# Altium footprint library PCB1.PcbLib: 54 footprints (part 4 of 4)
Each footprint in its own frame and in the unit in brackets; x right, y up, seen from the top. Pads: shape width x height; smd on the part's side, far side on the other; paste and mask are expansions set on the pad; w line width, h text height; cw(c..) or ccw(c..) is an arc to the next point about the centre after c.
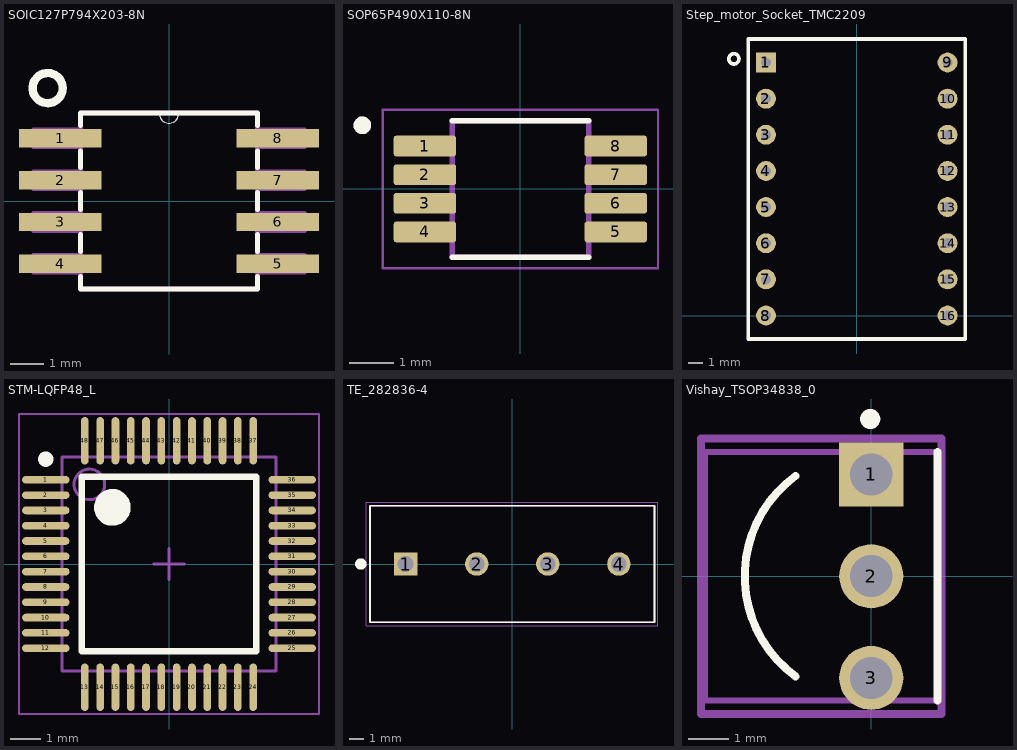
[diagram p3: the footprints below, top view; thin cyan lines are the x and y axes]

## SOIC127P794X203-8N [mil]
pads (8):
  rect 98.43x22 smd: 1(-130,75) 2(-130,25) 3(-130,-25) 4(-130,-75) 5(130,-75) 6(130,-25) 7(130,25) 8(130,75)
Top Overlay:
  circle w10: c-145,135 r18.03
  lines w0: -12,105 ccw(c0,105) 12,105
  lines w6: -106,-90 -106,-105 106,-105 106,-90 ; -106,-60 -106,-40 ; -106,-10 -106,10 ; -106,40 -106,60 ; -106,90 -106,105 -12,105 12,105 106,105 106,90 ; 106,-60 106,-40 ; 106,-10 106,10 ; 106,40 106,60
Mechanical 13:
  lines w0: -12,105 ccw(c0,105) 12,105
  lines w6: -162,-85 -106,-85 -106,-65 -162,-65 -162,-85 ; -162,-35 -106,-35 -106,-15 -162,-15 -162,-35 ; -162,15 -106,15 -106,35 -162,35 -162,15 ; -162,65 -106,65 -106,85 -162,85 -162,65 ; -106,-105 -106,105 -12,105 12,105 106,105 106,-105 -106,-105 ; 106,-85 162,-85 162,-65 106,-65 106,-85 ; 106,-35 162,-35 162,-15 106,-15 106,-35 ; 106,15 162,15 162,35 106,35 106,15 ; 106,65 162,65 162,85 106,85 106,65
3D body "SN.STEP": height 68.9, standoff 0, extent -118.11,-96.46 118.11,96.46

## SOP65P490X110-8N [mm]
pads (8):
  rrect25% 1.42x0.47 smd: 1(-2.165,0.975) 2(-2.165,0.325) 3(-2.165,-0.325) 4(-2.165,-0.975) 5(2.165,-0.975) 6(2.165,-0.325) 7(2.165,0.325) 8(2.165,0.975)
Top Overlay:
  circle w0.2: c-3.585,1.445 r0.1
  lines w0.127: -1.55,-1.55 1.55,-1.55 ; -1.55,1.55 1.55,1.55
Mechanical 13:
  circle w0.2: c-3.585,1.445 r0.1
  lines w0.127: -1.55,-1.55 1.55,-1.55 1.55,1.55 -1.55,1.55 -1.55,-1.55
Mechanical 15:
  lines w0.05: -3.125,-1.8 3.125,-1.8 3.125,1.8 -3.125,1.8 -3.125,-1.8
3D body "DS1339AU+.STEP": height 1.1, standoff 0, extent -2.452,-1.5 2.452,1.5

## Step_motor_Socket_TMC2209 [mm]
pads (16):
  rect 1.4x1.4 hole 0.7: 1(-6.38,17.78)
  round 1.4 hole 0.7: 2(-6.38,15.24) 3(-6.38,12.7) 4(-6.38,10.16) 5(-6.38,7.62) 6(-6.38,5.08) 7(-6.38,2.54) 8(-6.38,0) 9(6.38,17.78) 10(6.38,15.24) 11(6.38,12.7) 12(6.38,10.16) 13(6.38,7.62) 14(6.38,5.08) 15(6.38,2.54) 16(6.38,0)
Top Overlay:
  circle w0.254: c-8.636,18.034 r0.359
  lines w0.254: -7.62,-1.651 -7.62,0 -7.62,19.431 6.223,19.431 7.62,19.431 7.62,0 7.62,-1.651 -7.62,-1.651
3D body: height 8.5, standoff 0, extent -7.65,16.129 -5.11,16.891
3D body: height 8.5, standoff 0, extent -7.65,13.589 -5.11,14.351
3D body: height 8.5, standoff 0, extent -7.65,11.049 -5.11,11.811
3D body: height 8.5, standoff 0, extent -7.65,8.509 -5.11,9.271
3D body: height 8.5, standoff 0, extent -7.65,5.969 -5.11,6.731
3D body: height 8.5, standoff 0, extent -7.65,3.429 -5.11,4.191
3D body: height 8.5, standoff 0, extent -7.65,0.889 -5.11,1.651
3D body: height 8.5, standoff 0, extent -7.65,-1.651 -5.11,-0.889
3D body: height 0.5, standoff 0, extent -7.65,-1.651 -5.11,19.304
3D body: height 8.5, standoff 0, extent -7.65,18.669 -5.11,19.304
3D body: height 8.5, standoff 0, extent -7.65,-1.651 -7.015,19.304
3D body: height 8.5, standoff 0, extent -5.745,-1.651 -5.11,19.304
3D body: height 0, standoff -3, extent -6.78,-0.4 -5.98,0.4
3D body: height 0, standoff -3, extent -6.78,4.68 -5.98,5.48
3D body: height 0, standoff -3, extent -6.78,7.22 -5.98,8.02
3D body: height 0, standoff -3, extent -6.78,9.76 -5.98,10.56
3D body: height 0, standoff -3, extent -6.78,12.3 -5.98,13.1
3D body: height 0, standoff -3, extent -6.78,14.84 -5.98,15.64
3D body: height 0, standoff -3, extent -6.78,17.38 -5.98,18.18
3D body: height 0, standoff -3, extent -6.78,2.14 -5.98,2.94
3D body: height 8.5, standoff 0, extent 5.11,16.129 7.65,16.891
3D body: height 8.5, standoff 0, extent 5.11,13.589 7.65,14.351
3D body: height 8.5, standoff 0, extent 5.11,11.049 7.65,11.811
3D body: height 8.5, standoff 0, extent 5.11,8.509 7.65,9.271
3D body: height 8.5, standoff 0, extent 5.11,5.969 7.65,6.731
3D body: height 8.5, standoff 0, extent 5.11,3.429 7.65,4.191
3D body: height 8.5, standoff 0, extent 5.11,0.889 7.65,1.651
3D body: height 8.5, standoff 0, extent 5.11,-1.651 7.65,-0.889
3D body: height 0.5, standoff 0, extent 5.11,-1.651 7.65,19.304
3D body: height 8.5, standoff 0, extent 5.11,18.669 7.65,19.304
3D body: height 8.5, standoff 0, extent 5.11,-1.651 5.745,19.304
3D body: height 8.5, standoff 0, extent 7.015,-1.651 7.65,19.304
3D body: height 0, standoff -3, extent 5.98,-0.4 6.78,0.4
3D body: height 0, standoff -3, extent 5.98,4.68 6.78,5.48
3D body: height 0, standoff -3, extent 5.98,7.22 6.78,8.02
3D body: height 0, standoff -3, extent 5.98,9.76 6.78,10.56
3D body: height 0, standoff -3, extent 5.98,12.3 6.78,13.1
3D body: height 0, standoff -3, extent 5.98,14.84 6.78,15.64
3D body: height 0, standoff -3, extent 5.98,17.38 6.78,18.18
3D body: height 0, standoff -3, extent 5.98,2.14 6.78,2.94

## STM-LQFP48_L [mm]
pads (48):
  oval 1.55x0.25 smd: 1(-4.025,2.75) 2(-4.025,2.25) 3(-4.025,1.75) 4(-4.025,1.25) 5(-4.025,0.75) 6(-4.025,0.25) 7(-4.025,-0.25) 8(-4.025,-0.75) 9(-4.025,-1.25) 10(-4.025,-1.75) 11(-4.025,-2.25) 12(-4.025,-2.75) 25(4.025,-2.75) 26(4.025,-2.25) 27(4.025,-1.75) 28(4.025,-1.25) 29(4.025,-0.75) 30(4.025,-0.25) 31(4.025,0.25) 32(4.025,0.75) 33(4.025,1.25) 34(4.025,1.75) 35(4.025,2.25) 36(4.025,2.75)
  oval 0.25x1.55 smd: 13(-2.75,-4.025) 14(-2.25,-4.025) 15(-1.75,-4.025) 16(-1.25,-4.025) 17(-0.75,-4.025) 18(-0.25,-4.025) 19(0.25,-4.025) 20(0.75,-4.025) 21(1.25,-4.025) 22(1.75,-4.025) 23(2.25,-4.025) 24(2.75,-4.025) 37(2.75,4.025) 38(2.25,4.025) 39(1.75,4.025) 40(1.25,4.025) 41(0.75,4.025) 42(0.25,4.025) 43(-0.25,4.025) 44(-0.75,4.025) 45(-1.25,4.025) 46(-1.75,4.025) 47(-2.25,4.025) 48(-2.75,4.025)
Top Overlay:
  circle w0.6: c-1.85,1.85 r0.3
  circle w0.25: c-4.025,3.425 r0.125
  lines w0.2: -2.85,-2.85 2.85,-2.85 2.85,2.85 -2.85,2.85 -2.85,-2.85
Mechanical 13:
  circle w0.1: c-2.6,2.6 r0.5
  lines w0.1: -3.5,-3.5 3.5,-3.5 3.5,3.5 -3.5,3.5 -3.5,-3.5
Mechanical 15:
  lines w0.05: -4.9,-4.9 4.9,-4.9 4.9,4.9 -4.9,4.9 -4.9,-4.9
  lines w0.1: -0.5,0 0.5,0 ; 0,-0.5 0,0.5
3D body: height 1.6, standoff 0.05, extent -3.5,-3.5 3.5,3.5

## TE_282836-4 [mm]
pads (4):
  rect 1.65x1.65 hole 1.1: 1(-7.5,0)
  round 1.65 hole 1.1: 2(-2.5,0) 3(2.5,0) 4(7.5,0)
Top Overlay:
  circle w0.4: c-10.645,0 r0.2
  lines w0.127: -10,-4.1 10,-4.1 10,4.1 -10,4.1 -10,-4.1
Mechanical 13:
  lines w0.127: -10,-4.1 10,-4.1 10,4.1 -10,4.1 -10,-4.1
Mechanical 15:
  lines w0.05: -10.25,-4.35 -10.25,4.35 10.25,4.35 10.25,-4.35 -10.25,-4.35
3D body "282836-4--3DModel-STEP-1.STEP": height 10, standoff -3.5, extent -10.427,-4.009 10.173,4.191

## Vishay_TSOP34838_0 [mm]
pads (3):
  rect 1.6x1.6 hole 1.05 paste-1000 mask+0: 1(0,2.54)
  round 1.6 hole 1.05 paste-1000 mask+0: 2(0,0) 3(0,-2.54)
Top Overlay:
  circle w0.25: c-0.025,3.925 r0.125
  lines w0.2: -1.894,-2.5 cw(c-0.061,0) -1.894,2.5 ; 1.65,-3.1 1.65,3.1
Mechanical 10:
  lines w0.2: -4.25,-3.44 1.75,-3.44 1.75,3.44 -4.25,3.44 -4.25,-3.44
  text ".Designator" at -1.25,0 h1
Mechanical 12:
  lines w0.15: -4.15,-3.1 1.65,-3.1 1.65,3.1 -4.15,3.1 -4.15,-3.1
Mechanical 15:
  lines w0.1: -0.5,0 0.5,0 ; 0,-0.5 0,0.5
  lines w0.2: -4.25,-3.44 1.75,-3.44 1.75,3.44 -4.25,3.44 -4.25,-3.44
3D body "IC_Vishay_TSOP34838_eec.STEP": height 0.25, standoff 0, extent -4.25,-3.44 1.75,3.44